# Altium footprint library domino-wire-protector.PcbLib: 120 footprints (part 2 of 8)
Each footprint in its own frame and in the unit in brackets; x right, y up, seen from the top. Pads: shape width x height; smd on the part's side, far side on the other; paste and mask are expansions set on the pad; w line width, h text height; cw(c..) or ccw(c..) is an arc to the next point about the centre after c.
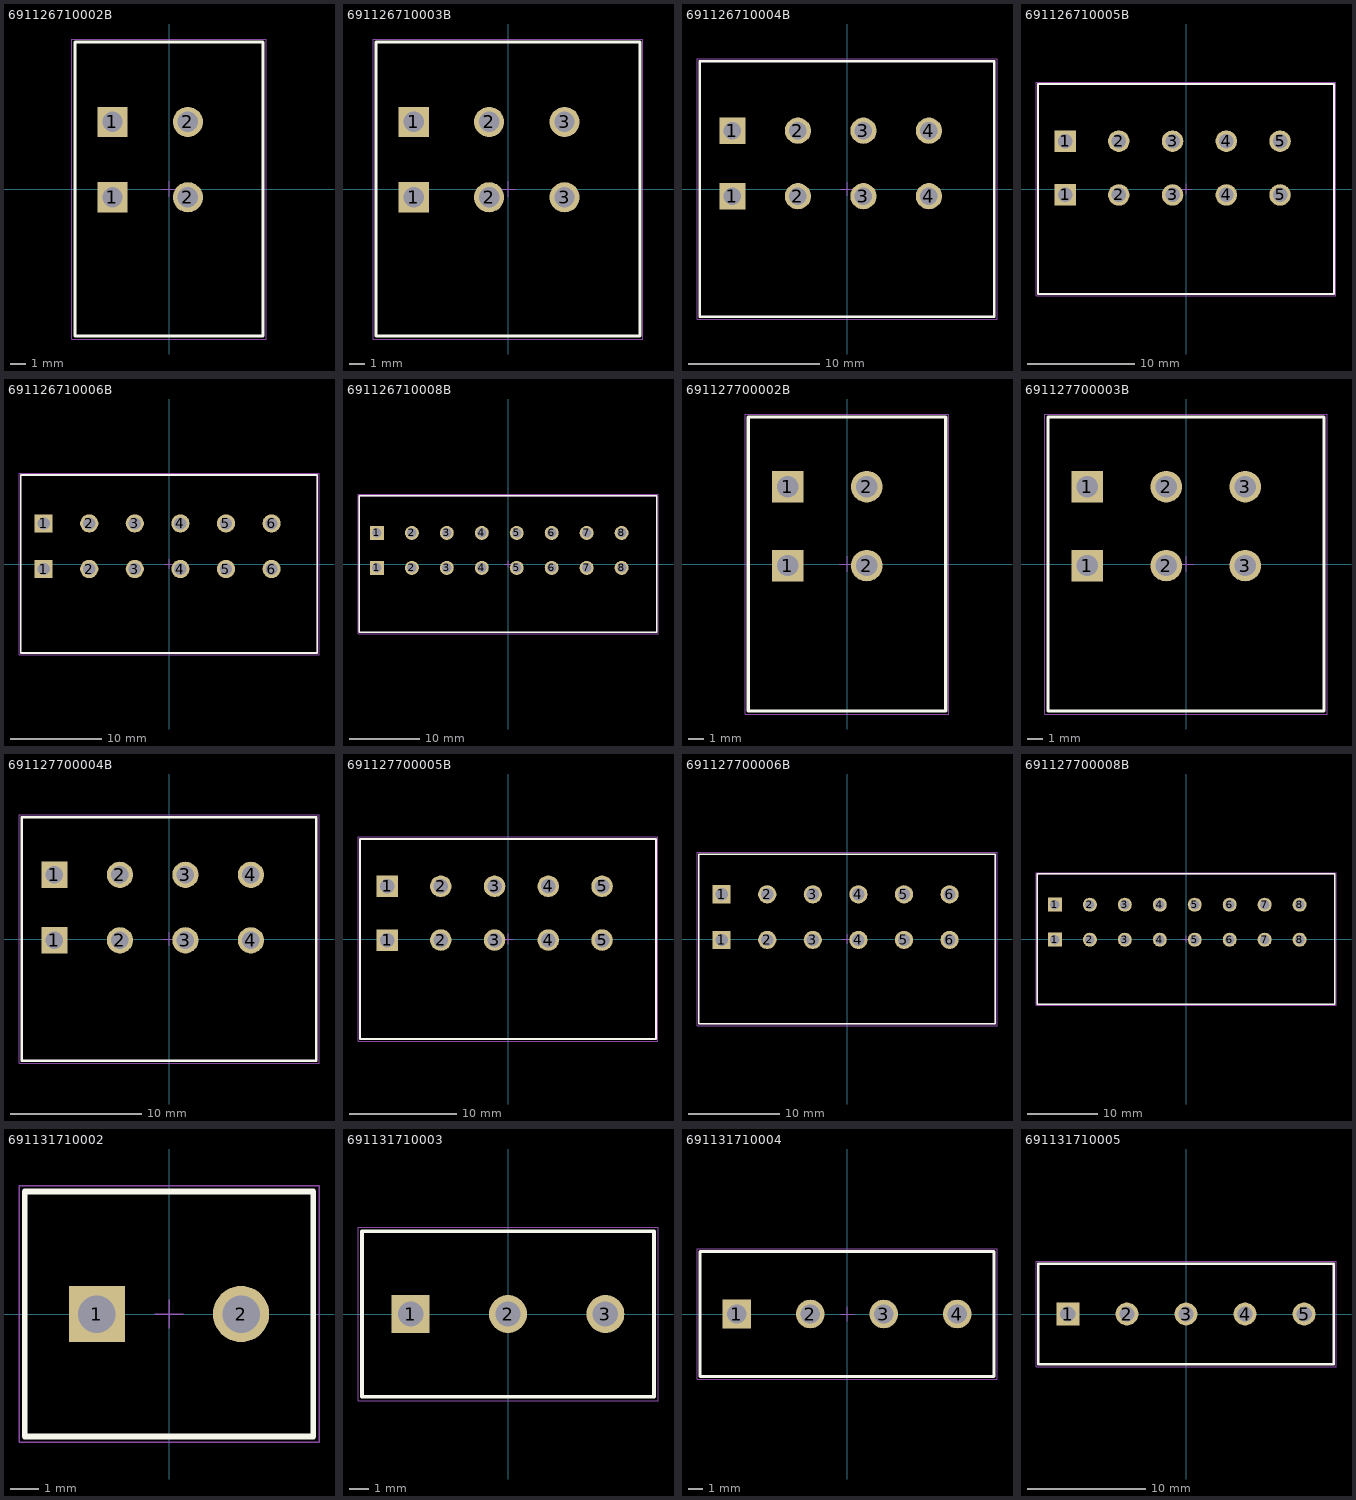
[diagram p1: the footprints below, top view; thin cyan lines are the x and y axes]

## 691126710002B [mm] "5,00 mm - PCB Horizontal - 02p"
height 18.6
pads (4):
  rect 2x2 hole 1.35: 1(-3.75,-0.55) 1(-3.75,4.45)
  round 2 hole 1.35: 2(1.25,-0.55) 2(1.25,4.45)
Top Overlay:
  lines w0.2: -6.25,-9.75 -6.25,9.75 6.25,9.75 6.25,-9.75 -6.25,-9.75
Mechanical 13:
  lines w0.1: -6.25,-9.75 6.25,-9.75 6.25,9.75 -6.25,9.75 -6.25,-9.75
Mechanical 15:
  lines w0.05: -0.5,0 0.5,0 ; 0,-0.5 0,0.5 ; -6.45,-9.95 -6.45,9.95 6.45,9.95 6.45,-9.95 -6.45,-9.95
3D body "691126710002B.stp": height 18.7, standoff -3.4, extent -6.25,-9.75 6.25,9.75

## 691126710003B [mm] "5,00 mm - PCB Horizontal - 03p"
height 18.6
pads (6):
  rect 2x2 hole 1.35: 1(-6.25,-0.55) 1(-6.25,4.45)
  round 2 hole 1.35: 2(-1.25,-0.55) 2(-1.25,4.45) 3(3.75,-0.55) 3(3.75,4.45)
Top Overlay:
  lines w0.2: -8.75,-9.75 8.75,-9.75 8.75,9.75 -8.75,9.75 -8.75,-9.75
Mechanical 13:
  lines w0.1: -8.75,-9.75 -8.75,9.75 8.75,9.75 8.75,-9.75 -8.75,-9.75
Mechanical 15:
  lines w0.05: -0.5,0 0.5,0 ; 0,-0.5 0,0.5 ; -8.95,-9.95 8.95,-9.95 8.95,9.95 -8.95,9.95 -8.95,-9.95
3D body "691126710003B.stp": height 18.7, standoff -3.4, extent -8.75,-9.75 8.75,9.75

## 691126710004B [mm] "5,00 mm - PCB Horizontal - 04p"
height 18.6
pads (8):
  rect 2x2 hole 1.35: 1(-8.75,-0.55) 1(-8.75,4.45)
  round 2 hole 1.35: 2(-3.75,-0.55) 2(-3.75,4.45) 3(1.25,-0.55) 3(1.25,4.45) 4(6.25,-0.55) 4(6.25,4.45)
Top Overlay:
  lines w0.2: -11.25,-9.75 11.25,-9.75 11.25,9.75 -11.25,9.75 -11.25,-9.75
Mechanical 13:
  lines w0.1: -11.25,-9.75 -11.25,9.75 11.25,9.75 11.25,-9.75 -11.25,-9.75
Mechanical 15:
  lines w0.05: -0.5,0 0.5,0 ; 0,-0.5 0,0.5 ; -11.45,-9.95 11.45,-9.95 11.45,9.95 -11.45,9.95 -11.45,-9.95
3D body "691126710004B.stp": height 18.7, standoff -3.4, extent -11.25,-9.75 11.25,9.75

## 691126710005B [mm] "5,00 mm - PCB Horizontal - 05p"
height 18.6
pads (10):
  rect 2x2 hole 1.35: 1(-11.25,-0.55) 1(-11.25,4.45)
  round 2 hole 1.35: 2(-6.25,-0.55) 2(-6.25,4.45) 3(-1.25,-0.55) 3(-1.25,4.45) 4(3.75,-0.55) 4(3.75,4.45) 5(8.75,-0.55) 5(8.75,4.45)
Top Overlay:
  lines w0.2: -13.75,-9.75 -13.75,9.75 13.75,9.75 13.75,-9.75 -13.75,-9.75
Mechanical 13:
  lines w0.1: -13.75,-9.75 13.75,-9.75 13.75,9.75 -13.75,9.75 -13.75,-9.75
Mechanical 15:
  lines w0.05: -0.5,0 0.5,0 ; 0,-0.5 0,0.5 ; -13.95,-9.95 -13.95,9.95 13.95,9.95 13.95,-9.95 -13.95,-9.95
3D body "691126710005B.stp": height 18.7, standoff -3.4, extent -13.75,-9.75 13.75,9.75

## 691126710006B [mm] "5,00 mm - PCB Horizontal - 06p"
height 18.6
pads (12):
  rect 2x2 hole 1.35: 1(-13.75,-0.55) 1(-13.75,4.45)
  round 2 hole 1.35: 2(-8.75,-0.55) 2(-8.75,4.45) 3(-3.75,-0.55) 3(-3.75,4.45) 4(1.25,-0.55) 4(1.25,4.45) 5(6.25,-0.55) 5(6.25,4.45) 6(11.25,-0.55) 6(11.25,4.45)
Top Overlay:
  lines w0.2: -16.25,-9.75 16.25,-9.75 16.25,9.75 -16.25,9.75 -16.25,-9.75
Mechanical 13:
  lines w0.1: -16.25,-9.75 -16.25,9.75 16.25,9.75 16.25,-9.75 -16.25,-9.75
Mechanical 15:
  lines w0.05: -0.5,0 0.5,0 ; 0,-0.5 0,0.5 ; -16.45,-9.95 16.45,-9.95 16.45,9.95 -16.45,9.95 -16.45,-9.95
3D body "691126710006B.stp": height 18.7, standoff -3.4, extent -16.25,-9.75 16.25,9.75

## 691126710008B [mm] "5,00 mm - PCB Horizontal - 08p"
height 18.6
pads (16):
  rect 2x2 hole 1.35: 1(-18.75,-0.55) 1(-18.75,4.45)
  round 2 hole 1.35: 2(-13.75,-0.55) 2(-13.75,4.45) 3(-8.75,-0.55) 3(-8.75,4.45) 4(-3.75,-0.55) 4(-3.75,4.45) 5(1.25,-0.55) 5(1.25,4.45) 6(6.25,-0.55) 6(6.25,4.45) 7(11.25,-0.55) 7(11.25,4.45) 8(16.25,-0.55) 8(16.25,4.45)
Top Overlay:
  lines w0.2: -21.25,-9.75 21.25,-9.75 21.25,9.75 -21.25,9.75 -21.25,-9.75
Mechanical 13:
  lines w0.1: -21.25,-9.75 -21.25,9.75 21.25,9.75 21.25,-9.75 -21.25,-9.75
Mechanical 15:
  lines w0.05: -0.5,0 0.5,0 ; 0,-0.5 0,0.5 ; -21.45,-9.95 21.45,-9.95 21.45,9.95 -21.45,9.95 -21.45,-9.95
3D body "691126710008B.stp": height 18.7, standoff -3.4, extent -21.25,-9.75 21.25,9.75

## 691127700002B [mm] "5,00 mm - PCB Vertical - 02p"
height 19.5
pads (4):
  rect 2x2 hole 1.35: 1(-3.75,-0.1) 1(-3.75,4.9)
  round 2 hole 1.35: 2(1.25,-0.1) 2(1.25,4.9)
Top Overlay:
  lines w0.2: -6.25,-9.3 6.25,-9.3 6.25,9.3 -6.25,9.3 -6.25,-9.3
Mechanical 13:
  lines w0.1: -6.25,-9.3 -6.25,9.3 6.25,9.3 6.25,-9.3 -6.25,-9.3
Mechanical 15:
  lines w0.05: -0.5,0 0.5,0 ; 0,-0.5 0,0.5 ; -6.45,-9.5 -6.45,9.5 6.45,9.5 6.45,-9.5 -6.45,-9.5
3D body "691127700002B.stp": height 19.6, standoff -3.4, extent -6.25,-9.3 6.25,9.3

## 691127700003B [mm] "5,00 mm - PCB Vertical - 03p"
height 19.5
pads (6):
  rect 2x2 hole 1.35: 1(-6.25,-0.1) 1(-6.25,4.9)
  round 2 hole 1.35: 2(-1.25,-0.1) 2(-1.25,4.9) 3(3.75,-0.1) 3(3.75,4.9)
Top Overlay:
  lines w0.2: -8.75,-9.3 8.75,-9.3 8.75,9.3 -8.75,9.3 -8.75,-9.3
Mechanical 13:
  lines w0.1: -8.75,-9.3 -8.75,9.3 8.75,9.3 8.75,-9.3 -8.75,-9.3
Mechanical 15:
  lines w0.05: -0.5,0 0.5,0 ; 0,-0.5 0,0.5 ; -8.95,-9.5 -8.95,9.5 8.95,9.5 8.95,-9.5 -8.95,-9.5
3D body "691127700003B.stp": height 19.6, standoff -3.4, extent -8.75,-9.3 8.75,9.3

## 691127700004B [mm] "5,00 mm - PCB Vertical - 04p"
height 19.5
pads (8):
  rect 2x2 hole 1.35: 1(-8.75,-0.1) 1(-8.75,4.9)
  round 2 hole 1.35: 2(-3.75,-0.1) 2(-3.75,4.9) 3(1.25,-0.1) 3(1.25,4.9) 4(6.25,-0.1) 4(6.25,4.9)
Top Overlay:
  lines w0.2: -11.25,-9.3 -11.25,9.3 11.25,9.3 11.25,-9.3 -11.25,-9.3
Mechanical 13:
  lines w0.1: -11.25,-9.3 11.25,-9.3 11.25,9.3 -11.25,9.3 -11.25,-9.3
Mechanical 15:
  lines w0.05: -0.5,0 0.5,0 ; 0,-0.5 0,0.5 ; -11.45,-9.5 11.45,-9.5 11.45,9.5 -11.45,9.5 -11.45,-9.5
3D body "691127700004B.stp": height 19.6, standoff -3.4, extent -11.25,-9.3 11.25,9.3

## 691127700005B [mm] "5,00 mm - PCB Vertical - 05p"
height 19.5
pads (10):
  rect 2x2 hole 1.35: 1(-11.25,-0.1) 1(-11.25,4.9)
  round 2 hole 1.35: 2(-6.25,-0.1) 2(-6.25,4.9) 3(-1.25,-0.1) 3(-1.25,4.9) 4(3.75,-0.1) 4(3.75,4.9) 5(8.75,-0.1) 5(8.75,4.9)
Top Overlay:
  lines w0.2: -13.75,-9.3 13.75,-9.3 13.75,9.3 -13.75,9.3 -13.75,-9.3
Mechanical 13:
  lines w0.1: -13.75,-9.3 -13.75,9.3 13.75,9.3 13.75,-9.3 -13.75,-9.3
Mechanical 15:
  lines w0.05: -0.5,0 0.5,0 ; 0,-0.5 0,0.5 ; -13.95,-9.5 -13.95,9.5 13.95,9.5 13.95,-9.5 -13.95,-9.5
3D body "691127700005B.stp": height 19.6, standoff -3.4, extent -13.75,-9.3 13.75,9.3

## 691127700006B [mm] "5,00 mm - PCB Vertical - 06p"
height 19.5
pads (12):
  rect 2x2 hole 1.35: 1(-13.75,-0.1) 1(-13.75,4.9)
  round 2 hole 1.35: 2(-8.75,-0.1) 2(-8.75,4.9) 3(-3.75,-0.1) 3(-3.75,4.9) 4(1.25,-0.1) 4(1.25,4.9) 5(6.25,-0.1) 5(6.25,4.9) 6(11.25,-0.1) 6(11.25,4.9)
Top Overlay:
  lines w0.2: -16.25,-9.3 16.25,-9.3 16.25,9.3 -16.25,9.3 -16.25,-9.3
Mechanical 13:
  lines w0.1: -16.25,-9.3 -16.25,9.3 16.25,9.3 16.25,-9.3 -16.25,-9.3
Mechanical 15:
  lines w0.05: -0.5,0 0.5,0 ; 0,-0.5 0,0.5 ; -16.45,-9.5 -16.45,9.5 16.45,9.5 16.45,-9.5 -16.45,-9.5
3D body "691127700006B.stp": height 19.6, standoff -3.4, extent -16.25,-9.3 16.25,9.3

## 691127700008B [mm] "5,00 mm - PCB Vertical - 08p"
height 19.5
pads (16):
  rect 2x2 hole 1.35: 1(-18.75,-0.1) 1(-18.75,4.9)
  round 2 hole 1.35: 2(-13.75,-0.1) 2(-13.75,4.9) 3(-8.75,-0.1) 3(-8.75,4.9) 4(-3.75,-0.1) 4(-3.75,4.9) 5(1.25,-0.1) 5(1.25,4.9) 6(6.25,-0.1) 6(6.25,4.9) 7(11.25,-0.1) 7(11.25,4.9) 8(16.25,-0.1) 8(16.25,4.9)
Top Overlay:
  lines w0.2: -21.25,-9.3 21.25,-9.3 21.25,9.3 -21.25,9.3 -21.25,-9.3
Mechanical 13:
  lines w0.1: -21.25,-9.3 -21.25,9.3 21.25,9.3 21.25,-9.3 -21.25,-9.3
Mechanical 15:
  lines w0.05: -0.5,0 0.5,0 ; 0,-0.5 0,0.5 ; -21.45,-9.5 -21.45,9.5 21.45,9.5 21.45,-9.5 -21.45,-9.5
3D body "691127700008B.stp": height 19.6, standoff -3.4, extent -21.25,-9.3 21.25,9.3

## 691131710002 [mm] "SERIE 1317 - 5.00 MM - HORIZONTAL CABLE ENTRY WITH PRESSURE CLAMP - WR-TBL"
height 15.5
pads (2):
  rect 1.95x1.95 hole 1.3: 1(-2.5,0)
  round 1.95 hole 1.3: 2(2.5,0)
Top Overlay:
  lines w0.2: -5,-4.25 -5,4.25 5,4.25 5,-4.25 -5,-4.25
Mechanical 13:
  lines w0.1: -5,-4.25 5,-4.25 5,4.25 -5,4.25 -5,-4.25
Mechanical 15:
  lines w0.05: -0.5,0 0.5,0 ; 0,-0.5 0,0.5 ; -5.2,-4.45 -5.2,4.45 5.2,4.45 5.2,-4.45 -5.2,-4.45
3D body "691131710002.stp": height 15.5, standoff -4.45, extent -5,-4.25 5,4.25

## 691131710003 [mm] "SERIE 1317 - 5.00 MM - HORIZONTAL CABLE ENTRY WITH PRESSURE CLAMP - WR-TBL"
height 15.5
pads (3):
  rect 1.95x1.95 hole 1.3: 1(-5,0)
  round 1.95 hole 1.3: 2(0,0) 3(5,0)
Top Overlay:
  lines w0.2: -7.5,-4.25 7.5,-4.25 7.5,4.25 -7.5,4.25 -7.5,-4.25
Mechanical 13:
  lines w0.1: -7.5,-4.25 -7.5,4.25 7.5,4.25 7.5,-4.25 -7.5,-4.25
Mechanical 15:
  lines w0.05: -0.5,0 0.5,0 ; 0,-0.5 0,0.5 ; -7.7,-4.45 7.7,-4.45 7.7,4.45 -7.7,4.45 -7.7,-4.45
3D body "691131710003.stp": height 15.5, standoff -4.45, extent -7.5,-4.25 7.5,4.25

## 691131710004 [mm] "SERIE 1317 - 5.00 MM - HORIZONTAL CABLE ENTRY WITH PRESSURE CLAMP - WR-TBL"
height 15.5
pads (4):
  rect 1.95x1.95 hole 1.3: 1(-7.5,0)
  round 1.95 hole 1.3: 2(-2.5,0) 3(2.5,0) 4(7.5,0)
Top Overlay:
  lines w0.2: -10,-4.25 -10,4.25 10,4.25 10,-4.25 -10,-4.25
Mechanical 13:
  lines w0.1: -10,-4.25 10,-4.25 10,4.25 -10,4.25 -10,-4.25
Mechanical 15:
  lines w0.05: -0.5,0 0.5,0 ; 0,-0.5 0,0.5 ; -10.2,-4.45 -10.2,4.45 10.2,4.45 10.2,-4.45 -10.2,-4.45
3D body "691131710004.stp": height 15.5, standoff -4.45, extent -10,-4.25 10,4.25

## 691131710005 [mm] "SERIE 1317 - 5.00 MM - HORIZONTAL CABLE ENTRY WITH PRESSURE CLAMP - WR-TBL"
height 15.5
pads (5):
  rect 1.95x1.95 hole 1.3: 1(-10,0)
  round 1.95 hole 1.3: 2(-5,0) 3(0,0) 4(5,0) 5(10,0)
Top Overlay:
  lines w0.2: -12.5,-4.25 12.5,-4.25 12.5,4.25 -12.5,4.25 -12.5,-4.25
Mechanical 13:
  lines w0.1: -12.5,-4.25 -12.5,4.25 12.5,4.25 12.5,-4.25 -12.5,-4.25
Mechanical 15:
  lines w0.05: -0.5,0 0.5,0 ; 0,-0.5 0,0.5 ; -12.7,-4.45 12.7,-4.45 12.7,4.45 -12.7,4.45 -12.7,-4.45
3D body "691131710005.stp": height 15.5, standoff -4.45, extent -12.5,-4.25 12.5,4.25